# Altium footprint library General.PcbLib: 246 footprints (part 16 of 16)
Each footprint in its own frame and in the unit in brackets; x right, y up, seen from the top. Pads: shape width x height; smd on the part's side, far side on the other; paste and mask are expansions set on the pad; w line width, h text height; cw(c..) or ccw(c..) is an arc to the next point about the centre after c.
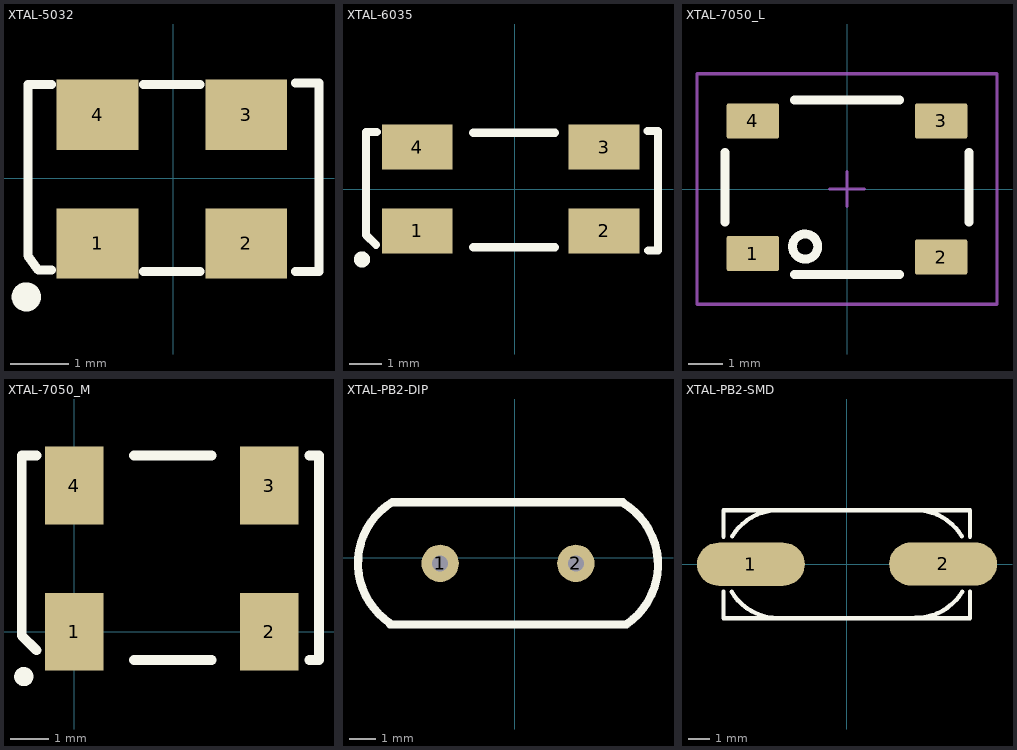
[diagram p15: the footprints below, top view; thin cyan lines are the x and y axes]

## XTAL-5032 [mm]
pads (4):
  rect 1.4x1.2 smd: 1(-1.295,-1.118) 2(1.245,-1.118) 3(1.245,1.082) 4(-1.295,1.082)
Top Overlay:
  circle w0.25: c-2.515,-2.032 r0.125
  lines w0.152: -2.083,-1.575 -2.309,-1.575 -2.489,-1.327 -2.489,1.6 -2.083,1.6 ; -0.508,-1.6 0.457,-1.6 ; -0.508,1.6 0.457,1.6 ; 2.083,-1.6 2.489,-1.6 2.489,1.626 2.083,1.626
3D body "User Library-0532.step": height 0.9, standoff -0.01, extent -2.5,-1.6 2.5,1.6

## XTAL-6035 [mm]
pads (4):
  rect 2.2x1.4 smd: 1(-3.031,-1.295) 2(2.769,-1.295) 3(2.769,1.305) 4(-3.031,1.305)
Top Overlay:
  circle w0.25: c-4.75,-2.184 r0.125
  lines w0.254: -4.318,-1.727 -4.623,-1.422 -4.623,1.778 -4.293,1.778 ; -1.295,-1.803 1.245,-1.803 ; -1.295,1.753 1.245,1.753 ; 4.115,1.803 4.445,1.803 4.445,-1.905 4.14,-1.905

## XTAL-7050_L [mm]
height 0.75
pads (4):
  rrect10% 1.5x1 smd: 1(-2.7,-1.85) 2(2.7,-1.95) 3(2.7,1.95) 4(-2.7,1.95)
Top Overlay:
  circle w0.254: c-1.2,-1.65 r0.361
  lines w0.254: -3.5,-0.95 -3.5,1.05 ; -1.5,-2.45 1.5,-2.45 ; -1.5,2.55 1.5,2.55 ; 3.5,-0.95 3.5,1.05
Mechanical 15:
  lines w0.1: -0.5,0 0.5,0 ; 0,-0.5 0,0.5 ; -4.3,-3.3 -4.3,3.3 4.3,3.3 4.3,-3.3 -4.3,-3.3
3D body "User Library-VX3-Quartz-Oscillator.STEP": height 1.6, standoff 0, extent -3.5,-2.5 3.5,2.5

## XTAL-7050_M [mil] "5*7mm"
pads (4):
  rect 60x80 smd: 1(0,0) 2(200,0) 3(200,150) 4(0,150)
Top Overlay:
  circle w9.84: c-52,-46 r4.92
  lines w10: -39,-19 -54.19,-3.81 -54.19,181 -39,181 ; 61,-29 141,-29 ; 61,181 141,181 ; 241,-29 251,-29 251,181 241,181
3D body "User Library-VX3-Quartz-Oscillator.STEP": height 62.99, standoff 0, extent -37.5,-23.42 238.09,173.43

## XTAL-PB2-DIP [mm]
pads (2):
  round 1.4 hole 0.6: 1(-2.794,-0.203) 2(2.286,-0.203)
Top Overlay:
  lines w0.305: -4.669,-2.489 4.185,-2.489 ; -4.669,-2.445 cw(c-3.175,-0.203) -4.58,2.096 ; -4.572,2.083 4.049,2.083 ; 4.049,2.058 cw(c2.667,-0.254) 4.185,-2.48
3D body "User Library-HP49US.STEP": height 3.6, standoff -3.9, extent -5.954,-2.503 5.396,2.147

## XTAL-PB2-SMD [mm]
height 14.8
pads (2):
  oval 5x2 smd: 1(-4.45,-0.004) 2(4.45,0.004)
Top Overlay:
  lines w0.2: -5.718,-1.27 -5.718,-2.504 5.7,-2.504 5.7,-1.27 ; -5.718,1.27 -5.718,2.496 ; -5.718,2.499 5.7,2.499 ; -5.343,-1.286 ccw(c-3.202,0.004) -3.175,-2.496 ; -5.316,1.29 cw(c-3.175,0) -3.175,2.5 ; 3.175,-2.487 ccw(c3.202,0.013) 5.344,-1.276 ; 3.176,2.501 cw(c3.176,0.001) 5.32,1.287 ; 5.7,1.27 5.7,2.496
3D body "User Library-hc49_cystal.STEP": height 4, standoff 0, extent -6.7,-2.439 6.7,2.462